# Altium footprint library CUSTOM PCB.PcbLib: 404 footprints (part 3 of 26)
Each footprint in its own frame and in the unit in brackets; x right, y up, seen from the top. Pads: shape width x height; smd on the part's side, far side on the other; paste and mask are expansions set on the pad; w line width, h text height; cw(c..) or ccw(c..) is an arc to the next point about the centre after c.
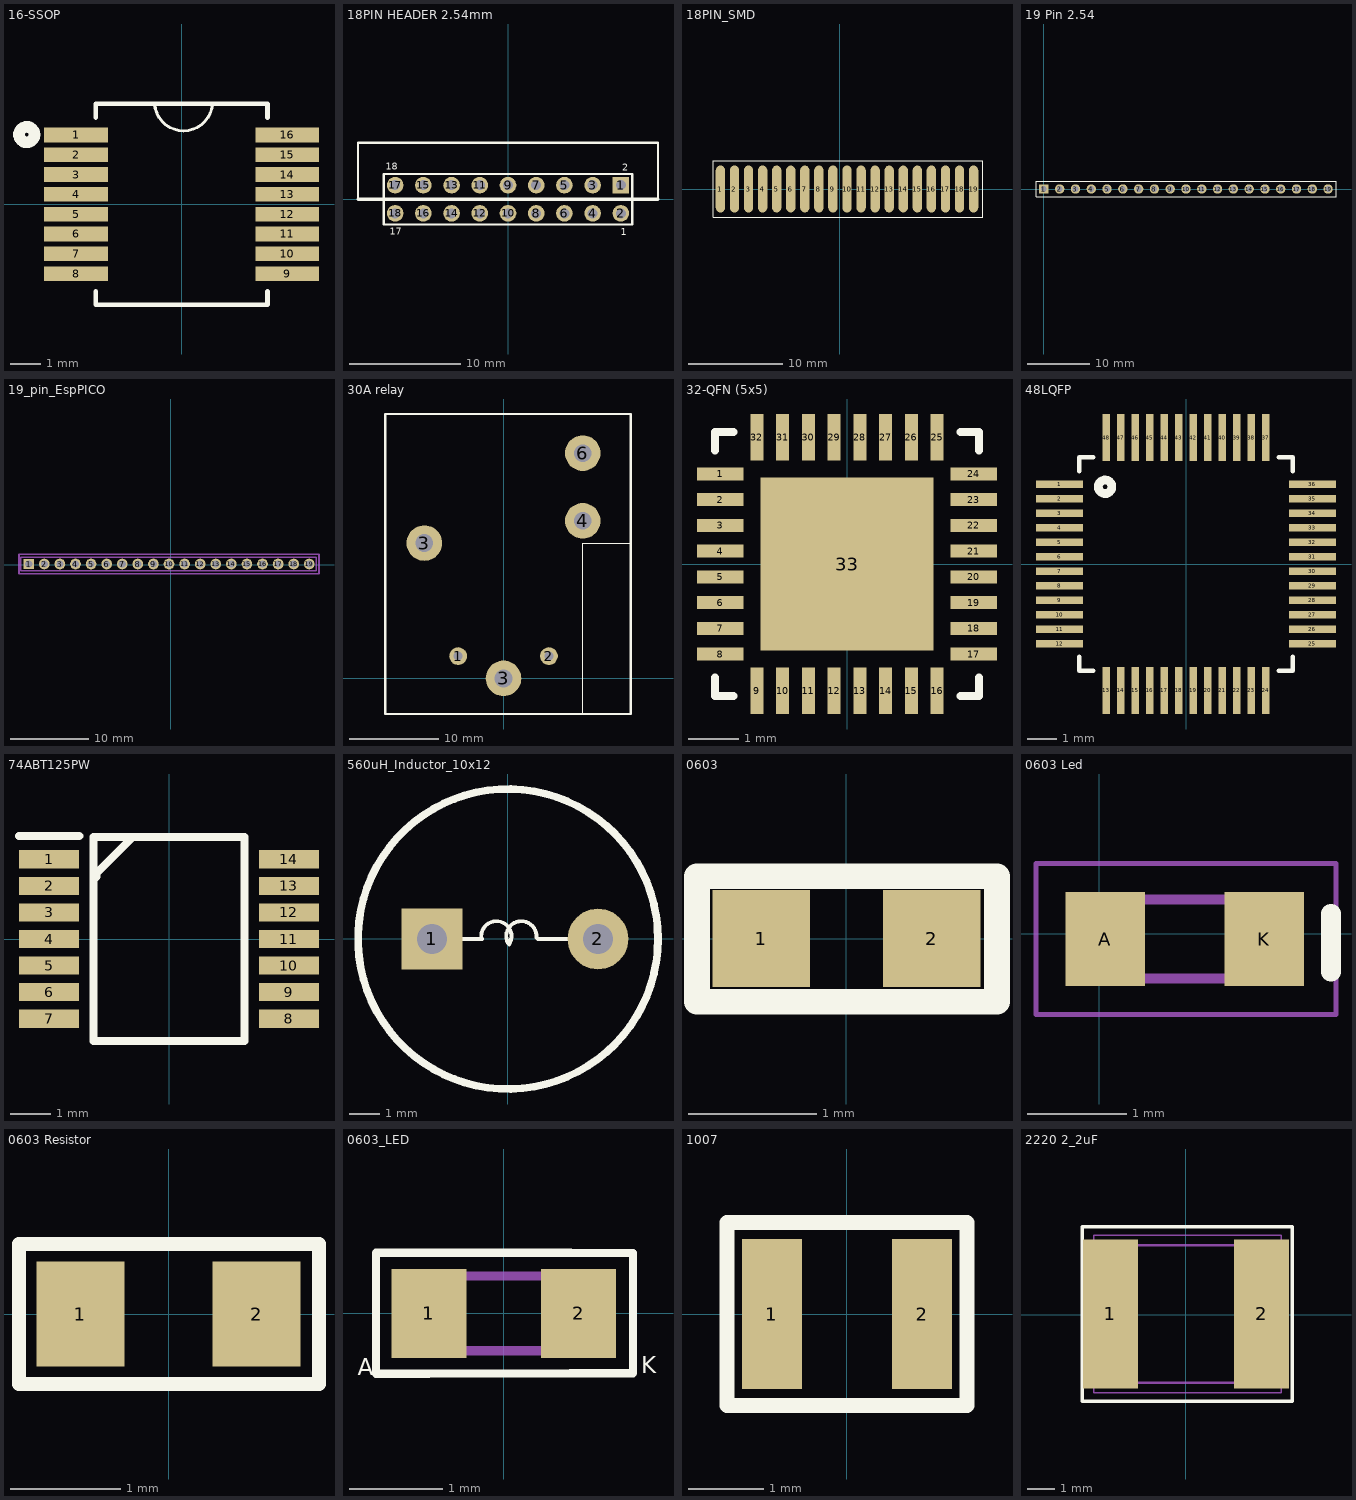
[diagram p2: the footprints below, top view; thin cyan lines are the x and y axes]

## 16-SSOP [mm]
pads (16):
  rect 2.091x0.482 smd paste+0 mask+0: 1(-3.463,2.275) 2(-3.463,1.625) 3(-3.463,0.975) 4(-3.463,0.325) 5(-3.463,-0.325) 6(-3.463,-0.975) 7(-3.463,-1.625) 8(-3.463,-2.275) 9(3.463,-2.275) 10(3.463,-1.625) 11(3.463,-0.975) 12(3.463,-0.325) 13(3.463,0.325) 14(3.463,0.975) 15(3.463,1.625) 16(3.463,2.275)
Top Overlay:
  circle w0.381: c-5.08,2.286 r0.254
  lines w0.1: -0.889,3.292 ccw(c0.064,3.366) 1.016,3.292
  lines w0.152: -2.817,-2.849 -2.817,-3.292 2.817,-3.292 2.817,-2.849 ; -2.817,2.849 -2.817,3.292 2.817,3.292 2.817,2.849
3D body "21-0056-E_90-0106-16L.step": height 1.99, standoff 0, extent -3.95,-3.165 3.95,3.165

## 18PIN HEADER 2.54mm [mm]
pads (18):
  rect 1.5x1.5 hole 0.9: 1(10.16,1.27)
  round 1.5 hole 0.9: 2(10.16,-1.27) 3(7.62,1.27) 4(7.62,-1.27) 5(5.08,1.27) 6(5.08,-1.27) 7(2.54,1.27) 8(2.54,-1.27) 9(0,1.27) 10(0,-1.27) 11(-2.54,1.27) 12(-2.54,-1.27) 13(-5.08,1.27) 14(-5.08,-1.27) 15(-7.62,1.27) 16(-7.62,-1.27) 17(-10.16,1.27) 18(-10.16,-1.27)
Top Overlay:
  lines w0.2: -13.5,0 -13.5,5.08 13.5,5.08 13.5,0 ; -11.176,-2.286 11.176,-2.286 11.176,2.261 -11.176,2.261 -11.176,-2.286
  lines w0.3: -13.5,0 0,0 13.5,0
  text "18" at -11.017,2.653 h0.64
  text "17" at -10.661,-3.214 h0.64
  text "2" at 10.268,2.577 h0.64
  text "1" at 10.141,-3.24 h0.64
3D body "7731710418lf.stp": height 5.25, standoff -2.65, extent -11.23,-2.826 11.23,9.885
3D body "7731710418lf.stp": height 5.25, standoff -2.65, extent -11.23,-1.556 11.23,11.155

## 18PIN_SMD [mm]
pads (19):
  oval 1x5 smd: 1(-12.75,0) 2(-11.25,0) 3(-9.75,0) 4(-8.25,0) 5(-6.75,0) 6(-5.25,0) 7(-3.75,0) 8(-2.25,0) 9(-0.75,0) 10(0.75,0) 11(2.25,0) 12(3.75,0) 13(5.25,0) 14(6.75,0) 15(8.25,0) 16(9.75,0) 17(11.25,0) 18(12.75,0) 19(14.25,0)
Top Overlay:
  lines w0.1: -13.5,-3 -13.5,3 15.24,3 15.24,-3 -13.5,-3

## 19 Pin 2.54 [mm]
pads (19):
  rect 1.5x1.5 hole 0.9: 1(0,0)
  round 1.5 hole 0.9: 2(2.54,0) 3(5.08,0) 4(7.62,0) 5(10.16,0) 6(12.7,0) 7(15.24,0) 8(17.78,0) 9(20.32,0) 10(22.86,0) 11(25.4,0) 12(27.94,0) 13(30.48,0) 14(33.02,0) 15(35.56,0) 16(38.1,0) 17(40.64,0) 18(43.18,0) 19(45.72,0)
Top Overlay:
  lines w0.2: 37.465,1.27 37.677,1.27 ; -1.27,-1.27 -1.27,1.27 0.635,1.27 46.99,1.27 46.99,-1.27 -1.27,-1.27
3D body "User Library-2PIN.SLDPRT": height 8, standoff -3, extent -1.295,-1.27 3.785,1.27
3D body "User Library-2PIN.SLDPRT": height 8, standoff -3, extent 3.785,-1.27 8.865,1.27
3D body "User Library-2PIN.SLDPRT": height 8, standoff -3, extent 8.865,-1.27 13.945,1.27
3D body "User Library-2PIN.SLDPRT": height 8, standoff -3, extent 13.945,-1.27 19.025,1.27
3D body "User Library-2PIN.SLDPRT": height 8, standoff -3, extent 19.025,-1.27 24.105,1.27
3D body "User Library-2PIN.SLDPRT": height 8, standoff -3, extent 24.105,-1.27 29.185,1.27
3D body "User Library-2PIN.SLDPRT": height 8, standoff -3, extent 29.185,-1.27 34.265,1.27
3D body "User Library-2PIN.SLDPRT": height 8, standoff -3, extent 34.265,-1.27 39.345,1.27
3D body "User Library-2PIN.SLDPRT": height 8, standoff -3, extent 39.345,-1.27 44.425,1.27
3D body "User Library-2PIN.SLDPRT": height 8, standoff -3, extent 41.885,-1.27 46.965,1.27

## 19_pin_EspPICO [mil]
pads (19):
  rect 52.29x52.29 / inner rect 60x60 / far side rect 52.29x52.29 hole 36: 1(-718.66,5)
  round 54 / inner round 60 / far side round 54 hole 36: 2(-639.92,5) 3(-561.18,5) 4(-482.44,5) 5(-403.7,5) 6(-324.96,5) 7(-246.22,5) 8(-167.48,5) 9(-88.74,5) 10(-10,5) 11(68.74,5) 12(147.48,5) 13(226.22,5) 14(304.96,5) 15(383.7,5) 16(462.44,5) 17(541.18,5) 18(619.92,5) 19(698.66,5)
Mechanical 8:
  region: -649.76,-4.84 -649.76,14.84 -630.08,14.84 -630.08,-4.84
  region: -728.5,-4.84 -728.5,14.84 -708.82,14.84 -708.82,-4.84
  region: -492.28,14.84 -472.6,14.84 -472.6,-4.84 -492.28,-4.84
  region: -571.02,14.84 -551.34,14.84 -551.34,-4.84 -571.02,-4.84
  region: -334.8,14.84 -315.12,14.84 -315.12,-4.84 -334.8,-4.84
  region: -413.54,14.84 -393.86,14.84 -393.86,-4.84 -413.54,-4.84
  region: -177.32,14.84 -157.64,14.84 -157.64,-4.84 -177.32,-4.84
  region: -256.06,14.84 -236.38,14.84 -236.38,-4.84 -256.06,-4.84
  region: -19.84,14.84 -0.16,14.84 -0.16,-4.84 -19.84,-4.84
  region: -98.58,14.84 -78.9,14.84 -78.9,-4.84 -98.58,-4.84
  region: 137.64,14.84 157.32,14.84 157.32,-4.84 137.64,-4.84
  region: 58.9,14.84 78.58,14.84 78.58,-4.84 58.9,-4.84
  region: 295.12,14.84 314.8,14.84 314.8,-4.84 295.12,-4.84
  region: 216.38,14.84 236.06,14.84 236.06,-4.84 216.38,-4.84
  region: 452.6,14.84 472.28,14.84 472.28,-4.84 452.6,-4.84
  region: 373.86,14.84 393.54,14.84 393.54,-4.84 373.86,-4.84
  region: 610.08,14.84 629.76,14.84 629.76,-4.84 610.08,-4.84
  region: 531.34,14.84 551.02,14.84 551.02,-4.84 531.34,-4.84
  region: 688.82,14.84 708.5,14.84 708.5,-4.84 688.82,-4.84
  lines w7.87: -760,-30 735,-30 735,40 -760,40 -760,-30
Mechanical 22:
  lines w8: -767.87,-44.21 747.87,-44.21 747.87,54.21 -767.87,54.21 -767.87,-44.21

## 30A relay [mm]
pads (6):
  round 2 hole 1: 1(-5.1,2.5) 2(5.1,2.5)
  round 4 hole 2: 3(-8.9,15.2) 3(0,0) 4(8.9,17.7) 6(8.9,25.3)
Top Overlay:
  lines w0.1: 8.9,-4 8.9,15.2 14.3,15.2
  lines w0.254: -13.3,-4 -13.3,29.7 -6.3,29.7 7.5,29.7 14.3,29.7 14.3,17.3 14.3,11.975 14.3,1.325 14.3,-4 -13.3,-4
3D body: height 20.4, standoff 0, extent -13.31,-4.013 14.275,29.693
3D body: height 3, standoff 0, extent -0.992,-0.998 1,0.998
3D body: height 3, standoff 0, extent 7.908,16.702 9.9,18.698
3D body: height 3, standoff 0, extent -9.892,14.202 -7.9,16.198
3D body: height 3, standoff 0, extent 4.604,2.001 5.6,2.999
3D body: height 3, standoff 0, extent -5.596,2.001 -4.6,2.999
3D body: height 3, standoff 0, extent 7.908,24.302 9.9,26.298

## 32-QFN (5x5) [mil]
pads (33):
  rect 36x10 smd paste+0 mask+0: 1(-98.5,70) 2(-98.5,50) 3(-98.5,30) 4(-98.5,10) 5(-98.5,-10) 6(-98.5,-30) 7(-98.5,-50) 8(-98.5,-70) 17(98.5,-70) 18(98.5,-50) 19(98.5,-30) 20(98.5,-10) 21(98.5,10) 22(98.5,30) 23(98.5,50) 24(98.5,70)
  rect 10x36 smd paste+0 mask+0: 9(-70,-98.5) 10(-50,-98.5) 11(-30,-98.5) 12(-10,-98.5) 13(10,-98.5) 14(30,-98.5) 15(50,-98.5) 16(70,-98.5) 25(70,98.5) 26(50,98.5) 27(30,98.5) 28(10,98.5) 29(-10,98.5) 30(-30,98.5) 31(-50,98.5) 32(-70,98.5)
  rect 134x134 smd paste-66.5 mask-66.5: 33(0,0)
Top Overlay:
  lines w6: -102.5,-88.1 -102.5,-102.5 -88.1,-102.5 ; -102.5,88.1 -102.5,102.5 -88.1,102.5 ; 88.1,-102.5 102.5,-102.5 102.5,-88.1 ; 88.1,102.5 102.5,102.5 102.5,88.1
  text "." at -140,65 h60
Top Paste:
  drawing of 25 lines, arcs and shapes, not listed
Top Solder:
  region: -69.5,54.37 -69.5,69.5 69.5,69.5 69.5,54.37
  region: -69.5,23.37 -69.5,38.63 69.5,38.63 69.5,23.37
  region: -69.5,-7.63 -69.5,7.63 69.5,7.63 69.5,-7.63
  region: -69.5,-38.63 -69.5,-23.37 69.5,-23.37 69.5,-38.63
  region: -69.5,-69.5 -69.5,-54.37 69.5,-54.37 69.5,-69.5
  region: -69.5,-69.5 -69.5,69.5 -54.37,69.5 -54.37,-69.5
  region: -23.37,-69.5 -23.37,69.5 -38.63,69.5 -38.63,-69.5
  region: 7.63,-69.5 7.63,69.5 -7.63,69.5 -7.63,-69.5
  region: 38.63,-69.5 38.63,69.5 23.37,69.5 23.37,-69.5
  region: 54.37,-69.5 54.37,69.5 69.5,69.5 69.5,-69.5
3D body "QFN32_5X5MC_MCH.step": height 55.12, standoff 0, extent -100.51,-100.51 100.52,100.52
3D body: height 10, standoff 0, extent 0,0 10,10

## 48LQFP [mil]
pads (48):
  rect 64x10 smd: 1(-172,108.27) 2(-172,88.58) 3(-172,68.9) 4(-172,49.21) 5(-172,29.53) 6(-172,9.84) 7(-172,-9.84) 8(-172,-29.53) 9(-172,-49.21) 10(-172,-68.9) 11(-172,-88.58) 12(-172,-108.27) 25(172,-108.27) 26(172,-88.58) 27(172,-68.9) 28(172,-49.21) 29(172,-29.53) 30(172,-9.84) 31(172,9.84) 32(172,29.53) 33(172,49.21) 34(172,68.9) 35(172,88.58) 36(172,108.27)
  rect 10x64 smd: 13(-108.27,-172) 14(-88.58,-172) 15(-68.9,-172) 16(-49.21,-172) 17(-29.53,-172) 18(-9.84,-172) 19(9.84,-172) 20(29.53,-172) 21(49.21,-172) 22(68.9,-172) 23(88.58,-172) 24(108.27,-172) 37(108.27,172) 38(88.58,172) 39(68.9,172) 40(49.21,172) 41(29.53,172) 42(9.84,172) 43(-9.84,172) 44(-29.53,172) 45(-49.21,172) 46(-68.9,172) 47(-88.58,172) 48(-108.27,172)
Top Overlay:
  circle w11.81: c-110,105 r9.22
  lines w6: -145,-126.37 -145,-145 -126.37,-145 ; -145,126.37 -145,145 -126.37,145 ; 126.37,-145 145,-145 145,-126.37 ; 126.37,145 145,145 145,126.37
3D body "VBH48A-M.step": height 60.11, standoff -3, extent -182.01,-182.01 182.01,182.01

## 74ABT125PW [mm]
pads (14):
  rect 1.475x0.45 smd: 1(-2.938,1.95) 2(-2.938,1.3) 3(-2.938,0.65) 4(-2.938,0) 5(-2.938,-0.65) 6(-2.938,-1.3) 7(-2.938,-1.95) 8(2.938,-1.95) 9(2.938,-1.3) 10(2.938,-0.65) 11(2.938,0) 12(2.938,0.65) 13(2.938,1.3) 14(2.938,1.95)
Top Overlay:
  lines w0.2: -3.675,2.525 -2.2,2.525 ; -1.778,1.524 -1.778,1.611 -0.889,2.5 ; -1.85,-2.5 1.85,-2.5 1.85,2.5 -1.85,2.5 -1.85,-2.5
3D body "74ABT125PW,112.stp": height 1.1, standoff 0, extent -3.2,-2.5 3.2,2.5

## 560uH_Inductor_10x12 [mil] "1mH"
pads (2):
  rect 80x80 hole 39.37: 1(-100,0)
  round 80 hole 39.37: 2(118.11,0)
Top Overlay:
  circle w10: c0.01,-0.02 r196.85
  lines w5: -60.63,0 -34.02,0 ; -34.96,0.76 cw(c-15.27,3.52) 1.55,-7.07 ; -0.15,-5.19 cw(c17.55,3.62) 37.24,1.74 ; 39.2,0 88.08,0
3D body: height 472.44, standoff 0, extent -193.83,-194.78 199.87,198.92

## 0603 [mil]
pads (2):
  rect 30x30 smd: 1(-26.26,0) 2(26.26,0)
Top Overlay:
  lines w7.87: -46.06,-19.48 -46.06,19.18 46.37,19.18 46.37,-19.48 -46.06,-19.48
3D body "SMD R-0603.STEP": height 17.52, standoff -0.2, extent -31.5,-15.75 31.5,15.75

## 0603 Led [mm]
pads (2):
  rect 0.8x0.95 smd: A(0.064,-0.051) K(1.664,-0.051)
Top Overlay:
  lines w0.2: 2.337,-0.381 2.337,0.203
Mechanical 15:
  lines w0.1: 0.064,0.082 0.331,0.349 ; 0.064,-0.451 0.064,0.349 1.664,0.349 1.664,-0.451 0.064,-0.451
Mechanical 20:
  lines w0.05: -0.635,-0.813 -0.635,0.711 2.388,0.711 2.388,-0.813 -0.635,-0.813
3D body "User Library-LED SMD0603.STEP": height 0.63, standoff -0.05, extent 0.064,-0.446 1.714,0.279

## 0603 Resistor [mm]
pads (2):
  rect 0.8x0.95 smd: 1(-0.8,0) 2(0.8,0)
Top Overlay:
  lines w0.125: -1.359,-0.635 -1.359,0.635 1.367,0.635 1.367,-0.635 -1.359,-0.635
3D body "SMD R-0603.STEP": height 0.45, standoff -0.01, extent -0.8,-0.4 0.8,0.4

## 0603_LED [mm]
pads (2):
  rect 0.8x0.95 smd: 1(-0.8,0) 2(0.8,0)
Top Overlay:
  lines w0.09: -1.365,-0.644 -0.799,-0.643 0.711,-0.641 1.381,-0.64 1.381,0.645 0.716,0.646 -0.795,0.648 -1.365,0.649 -1.365,-0.644
  text "A" at -1.558,-0.662 h0.18
  text "K" at 1.471,-0.638 h0.18
Mechanical 15:
  lines w0.1: -0.8,0.133 -0.533,0.4 ; -0.8,-0.4 -0.8,0.4 0.8,0.4 0.8,-0.4 -0.8,-0.4
3D body "LED SMD0603.step": height 0.68, standoff 0, extent -0.823,-0.356 0.827,0.369

## 1007 [mm]
pads (2):
  rect 0.8x2 smd: 1(-1,0) 2(1,0)
Top Overlay:
  lines w0.2: -1.6,-1.219 1.6,-1.219 1.6,1.219 -1.6,1.219 -1.6,-1.219
3D body "User Library-IND_1007.x_t": height 1.75, standoff -0.05, extent -1.25,-0.9 1.25,0.9

## 2220 2_2uF [mm]
pads (2):
  rect 2x5.41 smd: 1(-2.743,0.025) 2(2.743,0.025)
Top Overlay:
  lines w0.127: -3.759,-3.15 3.861,-3.15 3.861,3.2 -3.759,3.2 -3.759,-3.15
Mechanical 15:
  lines w0.1: -2.799,-2.475 2.901,-2.475 2.901,2.525 -2.799,2.525 -2.799,-2.475
Mechanical 20:
  lines w0.05: -3.354,-2.835 3.456,-2.835 3.456,2.885 -3.354,2.885 -3.354,-2.835
3D body "C5750X6S2W225K250KA.stp": height 2.77, standoff 0.03, extent -2.65,-2.45 2.65,2.45